# Altium footprint library Connectors_2,54mm.PcbLib: 400 footprints (part 23 of 26)
Each footprint in its own frame and in the unit in brackets; x right, y up, seen from the top. Pads: shape width x height; smd on the part's side, far side on the other; paste and mask are expansions set on the pad; w line width, h text height; cw(c..) or ccw(c..) is an arc to the next point about the centre after c.
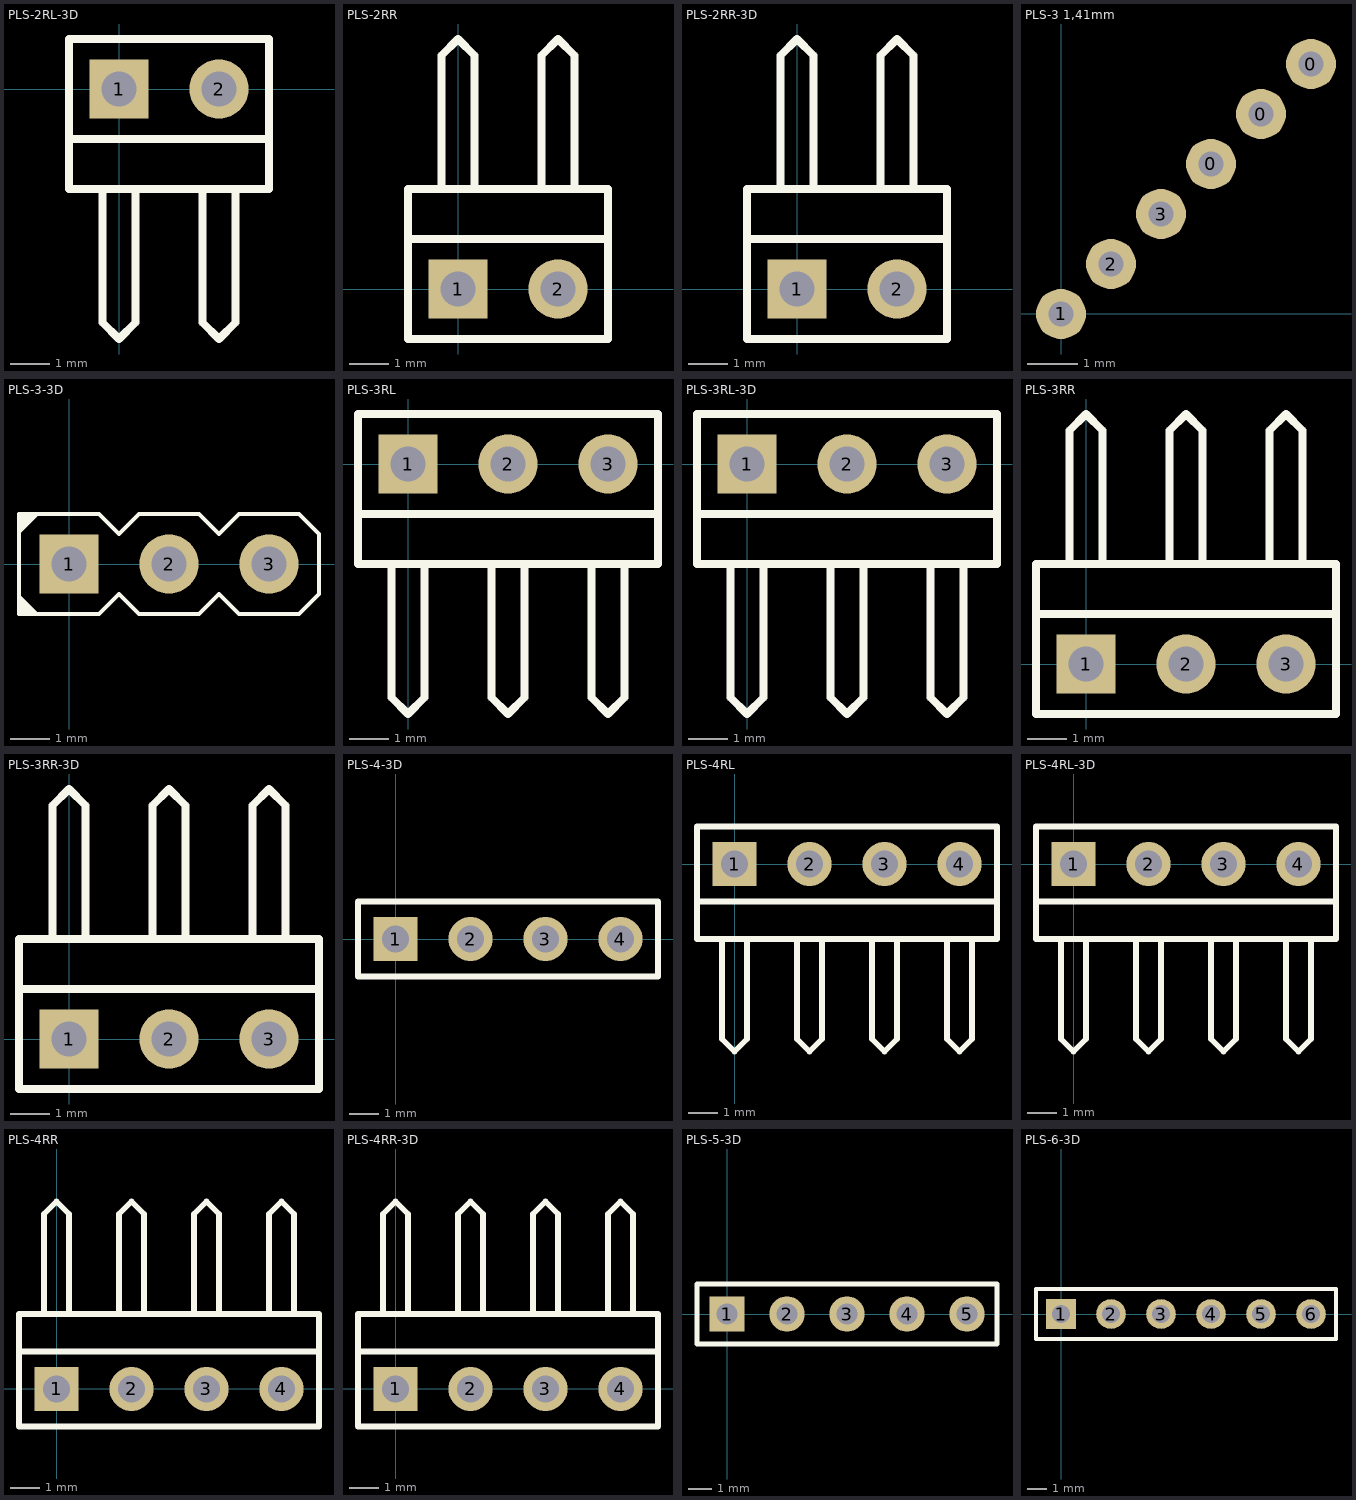
[diagram p22: the footprints below, top view; thin cyan lines are the x and y axes]

## PLS-2RL-3D [mm] "Connector; Header; 2 Position; Right Angle"
height 12
pads (2):
  rect 1.5x1.5 hole 0.9: 1(0,0)
  round 1.5 hole 0.9: 2(2.54,0)
Top Overlay:
  lines w0.2: -0.423,-2.54 -0.423,-5.927 0,-6.35 0.423,-5.927 0.423,-2.54 ; 2.117,-2.54 2.117,-5.927 2.54,-6.35 2.963,-5.927 2.963,-2.54 ; 3.81,-1.27 -1.27,-1.27 ; -1.27,-2.54 -1.27,-1.27 ; -1.27,-2.54 3.81,-2.54 3.81,1.27 -1.27,1.27 ; -1.27,-2.54 -1.27,1.27 ; -1.27,-1.27 -1.27,1.27
3D body "PLS-1R.step": height 5.45, standoff -3, extent 1.27,-7.35 3.81,1.27
3D body "PLS-1R.step": height 5.45, standoff -3, extent -1.27,-7.35 1.27,1.27

## PLS-2RR [mm] "Connector; Header; 2 Position; Right Angle"
height 12
pads (2):
  rect 1.5x1.5 hole 0.9: 1(0,0)
  round 1.5 hole 0.9: 2(2.54,0)
Top Overlay:
  lines w0.2: -1.27,1.27 3.81,1.27 ; -0.423,2.54 -0.423,5.927 0,6.35 0.423,5.927 0.423,2.54 ; 2.117,2.54 2.117,5.927 2.54,6.35 2.963,5.927 2.963,2.54 ; -1.27,-1.27 3.81,-1.27 3.81,2.54 -1.27,2.54 -1.27,-1.27

## PLS-2RR-3D [mm] "Connector; Header; 2 Position; Right Angle"
height 12
pads (2):
  rect 1.5x1.5 hole 0.9: 1(0,0)
  round 1.5 hole 0.9: 2(2.54,0)
Top Overlay:
  lines w0.2: -1.27,1.27 3.81,1.27 ; -0.423,2.54 -0.423,5.927 0,6.35 0.423,5.927 0.423,2.54 ; 2.117,2.54 2.117,5.927 2.54,6.35 2.963,5.927 2.963,2.54 ; -1.27,-1.27 -1.27,2.54 3.81,2.54 3.81,-1.27 -1.27,-1.27
3D body "PLS-1R.step": height 5.45, standoff -3, extent -1.27,-1.27 1.27,7.35
3D body "PLS-1R.step": height 5.45, standoff -3, extent 1.27,-1.27 3.81,7.35

## PLS-3 1,41mm [mm]
pads (6):
  round 1 hole 0.5: 0(3,3) 0(4,4) 0(5,5) 1(0,0) 2(1,1) 3(2,2)

## PLS-3-3D [mm] "Connector; Header; 3 Position"
height 7.5
pads (3):
  rect 1.5x1.5 hole 0.9: 1(0,0)
  round 1.5 hole 0.9: 2(2.54,0) 3(5.08,0)
Top Overlay:
  region: -1.27,0.762 -1.27,1.27 -0.762,1.27
  region: -0.762,-1.27 -1.27,-1.27 -1.27,-0.762
  lines w0.1: -1.27,-1.27 0.762,-1.27 1.27,-0.762 1.778,-1.27 3.302,-1.27 3.81,-0.762 4.318,-1.27 5.842,-1.27 6.35,-0.762 6.35,0.762 5.842,1.27 4.318,1.27 3.81,0.762 3.302,1.27 1.778,1.27 1.27,0.762 0.762,1.27 -1.27,1.27 -1.27,-1.27
3D body "PLS-1.step": height 8.44, standoff -3, extent 3.81,-1.27 6.35,1.27
3D body "PLS-1.step": height 8.44, standoff -3, extent 1.27,-1.27 3.81,1.27
3D body "PLS-1.step": height 8.44, standoff -3, extent -1.27,-1.27 1.27,1.27

## PLS-3RL [mm] "Connector; Header; 3 Position; Right Angle"
height 12
pads (3):
  rect 1.5x1.5 hole 0.9: 1(0,0)
  round 1.5 hole 0.9: 2(2.54,0) 3(5.08,0)
Top Overlay:
  lines w0.2: -0.423,-2.54 -0.423,-5.927 0,-6.35 0.423,-5.927 0.423,-2.54 ; 2.117,-2.54 2.117,-5.927 2.54,-6.35 2.963,-5.927 2.963,-2.54 ; 4.657,-2.54 4.657,-5.927 5.08,-6.35 5.503,-5.927 5.503,-2.54 ; 6.35,-1.27 -1.27,-1.27 ; -1.27,-2.54 -1.27,1.27 ; -1.27,-2.54 6.35,-2.54 6.35,1.27 -1.27,1.27 ; -1.27,-2.54 -1.27,-1.27 ; -1.27,-1.27 -1.27,1.27

## PLS-3RL-3D [mm] "Connector; Header; 3 Position; Right Angle"
height 12
pads (3):
  rect 1.5x1.5 hole 0.9: 1(0,0)
  round 1.5 hole 0.9: 2(2.54,0) 3(5.08,0)
Top Overlay:
  lines w0.2: -0.423,-2.54 -0.423,-5.927 0,-6.35 0.423,-5.927 0.423,-2.54 ; 2.117,-2.54 2.117,-5.927 2.54,-6.35 2.963,-5.927 2.963,-2.54 ; 4.657,-2.54 4.657,-5.927 5.08,-6.35 5.503,-5.927 5.503,-2.54 ; 6.35,-1.27 -1.27,-1.27 ; -1.27,-2.54 -1.27,-1.27 ; -1.27,-2.54 6.35,-2.54 6.35,1.27 -1.27,1.27 ; -1.27,-2.54 -1.27,1.27 ; -1.27,-1.27 -1.27,1.27
3D body "PLS-1R.step": height 5.45, standoff -3, extent -1.27,-7.35 1.27,1.27
3D body "PLS-1R.step": height 5.45, standoff -3, extent 1.27,-7.35 3.81,1.27
3D body "PLS-1R.step": height 5.45, standoff -3, extent 3.81,-7.35 6.35,1.27

## PLS-3RR [mm] "Connector; Header; 3 Position; Right Angle"
height 12
pads (3):
  rect 1.5x1.5 hole 0.9: 1(0,0)
  round 1.5 hole 0.9: 2(2.54,0) 3(5.08,0)
Top Overlay:
  lines w0.2: -1.27,1.27 6.35,1.27 ; -0.423,2.54 -0.423,5.927 0,6.35 0.423,5.927 0.423,2.54 ; 2.117,2.54 2.117,5.927 2.54,6.35 2.963,5.927 2.963,2.54 ; 4.657,2.54 4.657,5.927 5.08,6.35 5.503,5.927 5.503,2.54 ; -1.27,-1.27 6.35,-1.27 6.35,2.54 -1.27,2.54 -1.27,-1.27

## PLS-3RR-3D [mm] "Connector; Header; 3 Position; Right Angle"
height 12
pads (3):
  rect 1.5x1.5 hole 0.9: 1(0,0)
  round 1.5 hole 0.9: 2(2.54,0) 3(5.08,0)
Top Overlay:
  lines w0.2: -1.27,1.27 6.35,1.27 ; -0.423,2.54 -0.423,5.927 0,6.35 0.423,5.927 0.423,2.54 ; 2.117,2.54 2.117,5.927 2.54,6.35 2.963,5.927 2.963,2.54 ; 4.657,2.54 4.657,5.927 5.08,6.35 5.503,5.927 5.503,2.54 ; -1.27,-1.27 -1.27,2.54 6.35,2.54 6.35,-1.27 -1.27,-1.27
3D body "PLS-1R.step": height 5.45, standoff -3, extent 3.81,-1.27 6.35,7.35
3D body "PLS-1R.step": height 5.45, standoff -3, extent 1.27,-1.27 3.81,7.35
3D body "PLS-1R.step": height 5.45, standoff -3, extent -1.27,-1.27 1.27,7.35

## PLS-4-3D [mm] "Connector; Header; 4 Position"
height 7.5
pads (4):
  rect 1.5x1.5 hole 0.9: 1(0,0)
  round 1.5 hole 0.9: 2(2.54,0) 3(5.08,0) 4(7.62,0)
Top Overlay:
  lines w0.2: -1.27,-1.27 8.89,-1.27 8.89,1.27 -1.27,1.27 -1.27,-1.27
3D body "PLS-1.step": height 8.44, standoff -3, extent 6.35,-1.27 8.89,1.27
3D body "PLS-1.step": height 8.44, standoff -3, extent 3.81,-1.27 6.35,1.27
3D body "PLS-1.step": height 8.44, standoff -3, extent 1.27,-1.27 3.81,1.27
3D body "PLS-1.step": height 8.44, standoff -3, extent -1.27,-1.27 1.27,1.27

## PLS-4RL [mm] "Connector; Header; 4 Position; Right Angle"
height 12
pads (4):
  rect 1.5x1.5 hole 0.9: 1(0,0)
  round 1.5 hole 0.9: 2(2.54,0) 3(5.08,0) 4(7.62,0)
Top Overlay:
  lines w0.2: -0.423,-2.54 -0.423,-5.927 0,-6.35 0.423,-5.927 0.423,-2.54 ; 2.117,-2.54 2.117,-5.927 2.54,-6.35 2.963,-5.927 2.963,-2.54 ; 4.657,-2.54 4.657,-5.927 5.08,-6.35 5.503,-5.927 5.503,-2.54 ; 7.197,-2.54 7.197,-5.927 7.62,-6.35 8.043,-5.927 8.043,-2.54 ; -1.27,-1.27 -1.27,-2.54 8.89,-2.54 8.89,-1.27 ; -1.27,-1.27 8.89,-1.27 ; -1.27,-1.27 -1.27,1.27 8.89,1.27 8.89,-1.27

## PLS-4RL-3D [mm] "Connector; Header; 4 Position; Right Angle"
height 12
pads (4):
  rect 1.5x1.5 hole 0.9: 1(0,0)
  round 1.5 hole 0.9: 2(2.54,0) 3(5.08,0) 4(7.62,0)
Top Overlay:
  lines w0.2: -0.423,-2.54 -0.423,-5.927 0,-6.35 0.423,-5.927 0.423,-2.54 ; 2.117,-2.54 2.117,-5.927 2.54,-6.35 2.963,-5.927 2.963,-2.54 ; 4.657,-2.54 4.657,-5.927 5.08,-6.35 5.503,-5.927 5.503,-2.54 ; 7.197,-2.54 7.197,-5.927 7.62,-6.35 8.043,-5.927 8.043,-2.54 ; -1.27,-1.27 -1.27,-2.54 8.89,-2.54 8.89,-1.27 ; -1.27,-1.27 8.89,-1.27 ; -1.27,-1.27 8.89,-1.27 ; -1.27,-1.27 -1.27,1.27 8.89,1.27 8.89,-1.27
3D body "PLS-1R.step": height 5.45, standoff -3, extent -1.27,-7.35 1.27,1.27
3D body "PLS-1R.step": height 5.45, standoff -3, extent 1.27,-7.35 3.81,1.27
3D body "PLS-1R.step": height 5.45, standoff -3, extent 3.81,-7.35 6.35,1.27
3D body "PLS-1R.step": height 5.45, standoff -3, extent 6.35,-7.35 8.89,1.27

## PLS-4RR [mm] "Connector; Header; 4 Position; Right Angle"
height 12
pads (4):
  rect 1.5x1.5 hole 0.9: 1(0,0)
  round 1.5 hole 0.9: 2(2.54,0) 3(5.08,0) 4(7.62,0)
Top Overlay:
  lines w0.2: -0.423,2.54 -0.423,5.927 0,6.35 0.423,5.927 0.423,2.54 ; 2.117,2.54 2.117,5.927 2.54,6.35 2.963,5.927 2.963,2.54 ; 4.657,2.54 4.657,5.927 5.08,6.35 5.503,5.927 5.503,2.54 ; 7.197,2.54 7.197,5.927 7.62,6.35 8.043,5.927 8.043,2.54 ; -1.27,1.27 -1.27,-1.27 8.89,-1.27 8.89,1.27 ; -1.27,1.27 8.89,1.27 ; -1.27,1.27 8.89,1.27 ; -1.27,1.27 -1.27,2.54 8.89,2.54 8.89,1.27

## PLS-4RR-3D [mm] "Connector; Header; 4 Position; Right Angle"
height 12
pads (4):
  rect 1.5x1.5 hole 0.9: 1(0,0)
  round 1.5 hole 0.9: 2(2.54,0) 3(5.08,0) 4(7.62,0)
Top Overlay:
  lines w0.2: -0.423,2.54 -0.423,5.927 0,6.35 0.423,5.927 0.423,2.54 ; 2.117,2.54 2.117,5.927 2.54,6.35 2.963,5.927 2.963,2.54 ; 4.657,2.54 4.657,5.927 5.08,6.35 5.503,5.927 5.503,2.54 ; 7.197,2.54 7.197,5.927 7.62,6.35 8.043,5.927 8.043,2.54 ; -1.27,1.27 -1.27,2.54 8.89,2.54 8.89,1.27 ; -1.27,1.27 8.89,1.27 ; -1.27,1.27 8.89,1.27 ; -1.27,1.27 -1.27,-1.27 8.89,-1.27 8.89,1.27
3D body "PLS-1R.step": height 5.45, standoff -3, extent 6.35,-1.27 8.89,7.35
3D body "PLS-1R.step": height 5.45, standoff -3, extent 3.81,-1.27 6.35,7.35
3D body "PLS-1R.step": height 5.45, standoff -3, extent 1.27,-1.27 3.81,7.35
3D body "PLS-1R.step": height 5.45, standoff -3, extent -1.27,-1.27 1.27,7.35
3D body "PLS-1Rr.stp": height 7.99, standoff -3, extent -1.27,-3.81 1.27,7.35

## PLS-5-3D [mm] "Connector; Header; 5 Position"
height 7.5
pads (5):
  rect 1.5x1.5 hole 0.9: 1(0,0)
  round 1.5 hole 0.9: 2(2.54,0) 3(5.08,0) 4(7.62,0) 5(10.16,0)
Top Overlay:
  lines w0.2: -1.27,-1.27 11.43,-1.27 11.43,1.27 -1.27,1.27 -1.27,-1.27
3D body "PLS-1.step": height 8.44, standoff -3, extent 8.89,-1.27 11.43,1.27
3D body "PLS-1.step": height 8.44, standoff -3, extent 6.35,-1.27 8.89,1.27
3D body "PLS-1.step": height 8.44, standoff -3, extent 3.81,-1.27 6.35,1.27
3D body "PLS-1.step": height 8.44, standoff -3, extent 1.27,-1.27 3.81,1.27
3D body "PLS-1.step": height 8.44, standoff -3, extent -1.27,-1.27 1.27,1.27

## PLS-6-3D [mm] "Connector; Header; 6 Position"
height 7.5
pads (6):
  rect 1.5x1.5 hole 0.9: 1(0,0)
  round 1.5 hole 0.9: 2(2.54,0) 3(5.08,0) 4(7.62,0) 5(10.16,0) 6(12.7,0)
Top Overlay:
  lines w0.2: -1.27,-1.27 -1.27,1.27 13.97,1.27 13.97,-1.27 -1.27,-1.27
3D body "PLS-1.step": height 8.44, standoff -3, extent -1.27,-1.27 1.27,1.27
3D body "PLS-1.step": height 8.44, standoff -3, extent 1.27,-1.27 3.81,1.27
3D body "PLS-1.step": height 8.44, standoff -3, extent 3.81,-1.27 6.35,1.27
3D body "PLS-1.step": height 8.44, standoff -3, extent 6.35,-1.27 8.89,1.27
3D body "PLS-1.step": height 8.44, standoff -3, extent 8.89,-1.27 11.43,1.27
3D body "PLS-1.step": height 8.44, standoff -3, extent 11.43,-1.27 13.97,1.27